# Altium footprint library ParsaLibrary.PcbLib: 526 footprints (part 13 of 33)
Each footprint in its own frame and in the unit in brackets; x right, y up, seen from the top. Pads: shape width x height; smd on the part's side, far side on the other; paste and mask are expansions set on the pad; w line width, h text height; cw(c..) or ccw(c..) is an arc to the next point about the centre after c.
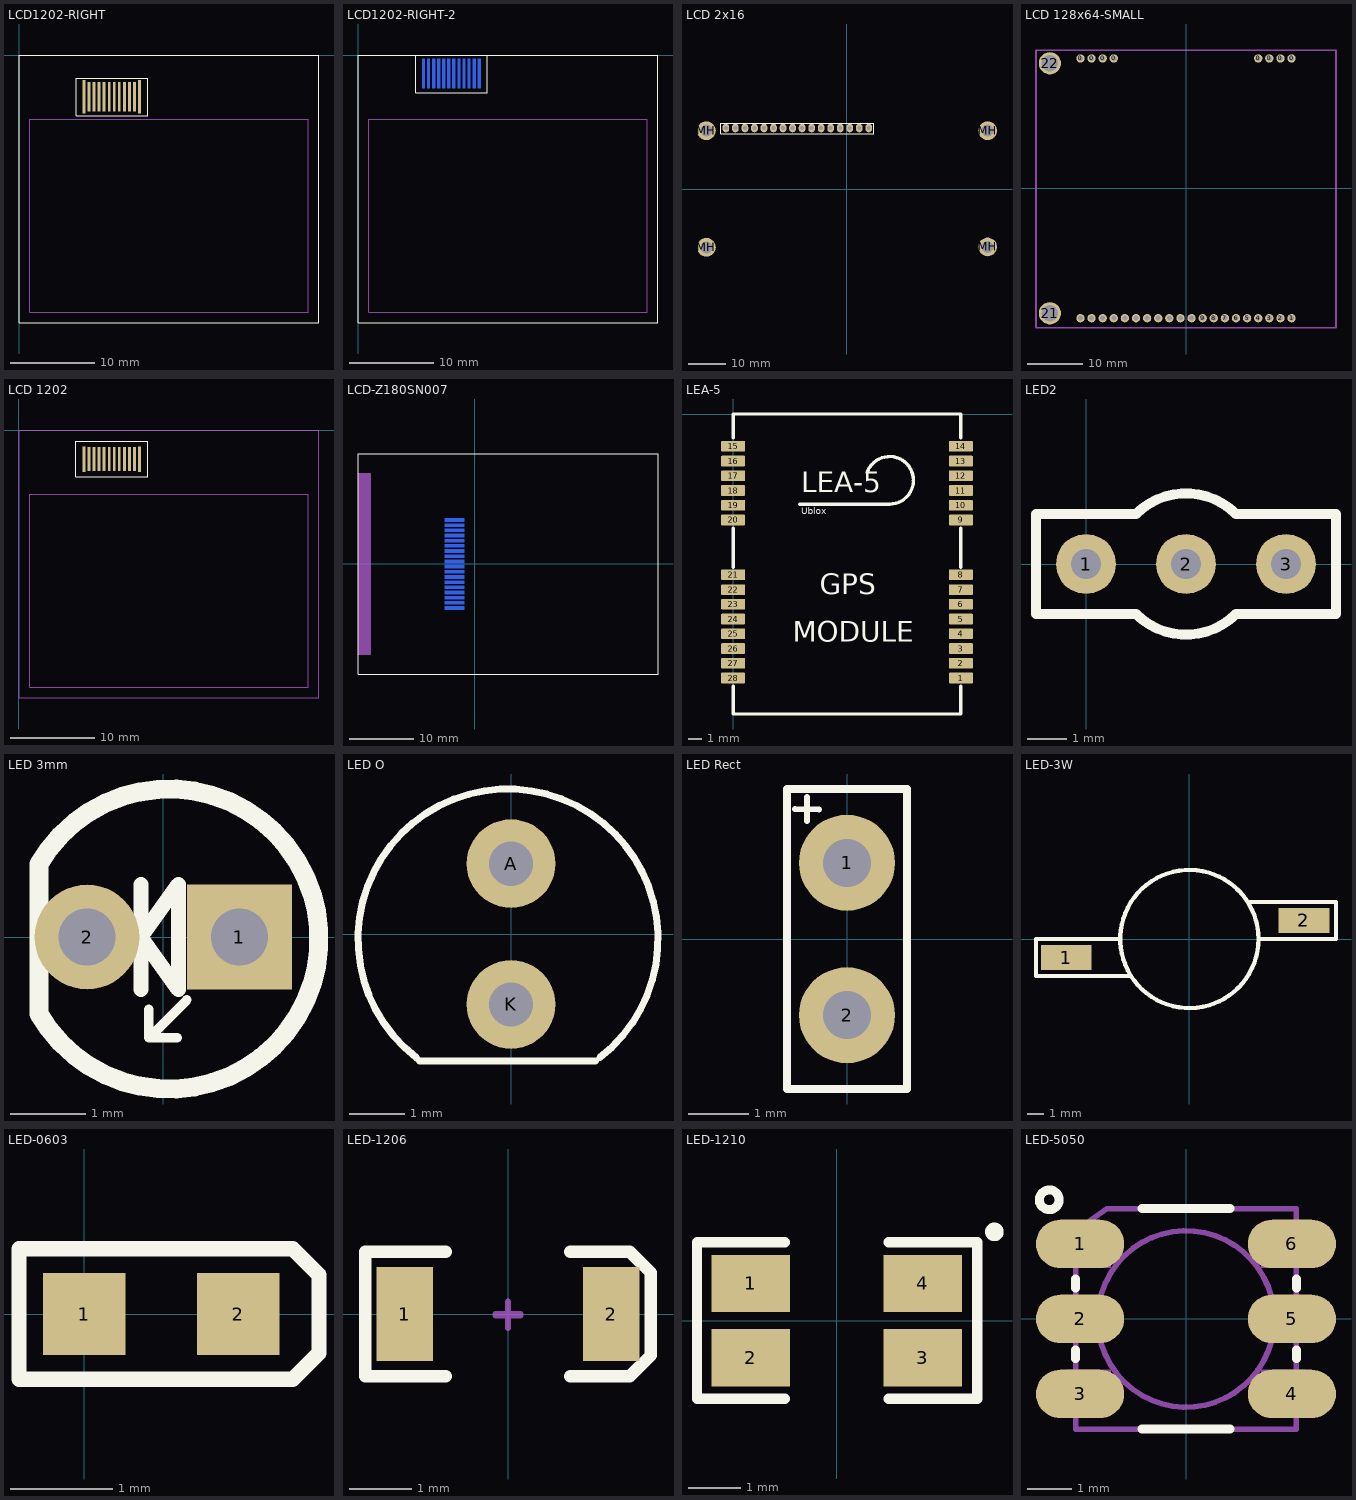
[diagram p12: the footprints below, top view; thin cyan lines are the x and y axes]

## LCD1202-RIGHT [mm]
pads (12):
  rect 0.33x4 smd: 0(7.69,-4.928) 11(14.29,-4.928)
  rect 0.33x3.5 smd: 1(8.29,-4.928) 2(8.89,-4.928) 3(9.49,-4.928) 4(10.09,-4.928) 5(10.69,-4.928) 6(11.29,-4.928) 7(11.89,-4.928) 8(12.49,-4.928) 9(13.09,-4.928) 10(13.69,-4.928)
Top Overlay:
  lines w0.127: 0,-31.75 35.56,-31.75 35.56,0 0,0 0,-31.75 ; 6.782,-7.188 15.272,-7.188 15.272,-2.718 6.782,-2.718 6.782,-7.188
Mechanical 16:
  lines w0.127: 1.27,-30.48 34.29,-30.48 34.29,-7.62 1.27,-7.62 1.27,-30.48

## LCD1202-RIGHT-2 [mm]
pads (12):
  rect 0.33x3.5 smd far side: 0(7.766,-2.21) 1(8.366,-2.21) 2(8.966,-2.21) 3(9.566,-2.21) 4(10.166,-2.21) 5(10.766,-2.21) 6(11.366,-2.21) 7(11.966,-2.21) 8(12.566,-2.21) 9(13.166,-2.21) 10(13.766,-2.21) 11(14.366,-2.21)
Top Overlay:
  lines w0.127: 6.858,0 6.858,-4.47 15.348,-4.47 15.348,0 ; 0,-31.75 35.56,-31.75 35.56,0 0,0 0,-31.75
Mechanical 16:
  lines w0.127: 1.27,-30.48 34.29,-30.48 34.29,-7.62 1.27,-7.62 1.27,-30.48
3D body: height 1.5, standoff 0, extent 0,-31.75 35.56,0
3D body: height 2, standoff 0, extent 1.27,-30.48 34.29,-7.62
3D body: height 1.6, standoff 0, extent 0.635,-6.985 34.925,-0.635

## LCD 2x16 [mm] "Character LCD, 2 Row, 16 Colunm"
height 1
pads (20):
  oval 1.778x2.286 hole 1.016: 1(-32.3,16.25) 2(-29.76,16.25) 3(-27.22,16.25) 4(-24.68,16.25) 5(-22.14,16.25) 6(-19.6,16.25) 7(-17.06,16.25) 8(-14.52,16.25) 9(-11.98,16.25) 10(-9.44,16.25) 11(-6.9,16.25) 12(-4.36,16.25) 13(-1.82,16.25) 14(0.72,16.25) 15(3.26,16.25) 16(5.8,16.25)
  round 5 hole 3.2: MH(-37.5,-15.55) MH(-37.5,15.55) MH(37.5,-15.45) MH(37.5,15.55)
Top Overlay:
  lines w0.254: -33.6,14.8 7.1,14.8 7.1,17.6 -33.6,17.6 -33.6,14.8
3D body "My LCD.STEP": height 21.52, standoff 8.31, extent -40.234,-18.39 40.266,18.11
3D body "header16-15mm.STEP": height 18.03, standoff -2.54, extent -33.57,14.98 7.07,17.52

## LCD 128x64-SMALL [mm]
pads (30):
  round 1.5 hole 0.9: 0(-19,23.375) 0(-17,23.375) 0(-15,23.375) 0(-13,23.375) 0(13,23.375) 0(15,23.375) 0(17,23.375) 0(19,23.375) 1(19,-23.375) 2(17,-23.375) 3(15,-23.375) 4(13,-23.375) 5(11,-23.375) 6(9,-23.375) 7(7,-23.375) 8(5,-23.375) 9(3,-23.375) 10(1,-23.375) 11(-1,-23.375) 12(-3,-23.375) 13(-5,-23.375) 14(-7,-23.375) 15(-9,-23.375) 16(-11,-23.375) 17(-13,-23.375) 18(-15,-23.375) 19(-17,-23.375) 20(-19,-23.375)
  round 4 hole 3: 21(-24.5,-22.5) 22(-24.5,22.5)
Mechanical 13:
  lines w0.3: -27,-25.125 -27,24.875 27,24.875 27,-25.125 -27,-25.125
3D body "User Library-User Library-WG12864e.step": height 13.2, standoff -4.8, extent -28,-25 27,25

## LCD 1202 [mil] "NOKIA 1202 LCD"
pads (12):
  rect 13x119 smd: 0(303.76,-134) 11(563.6,-134)
  rect 13x111 smd: 1(327.38,-134) 2(351,-134) 3(374.62,-134) 4(398.24,-134) 5(421.87,-134) 6(445.49,-134) 7(469.11,-134) 8(492.73,-134) 9(516.35,-134) 10(539.98,-134)
Top Overlay:
  lines w5: 266.75,-216 266.75,-51 601,-51 601,-216 266.75,-216
Mechanical 1:
  lines w5: 1,-1249 1,1 1401,1 1401,-1249 1,-1249 ; 51,-1199 51,-299 1351,-299 1351,-1199 51,-1199
3D body: height 78.74, standoff 0, extent 1,-1249 1401,1
3D body: height 94.49, standoff 0, extent 50,-1200 1350,-300

## LCD-Z180SN007 [mm]
pads (18):
  rect 3x0.5 smd far side: 1(-3.1,6.8) 2(-3.1,6) 3(-3.1,5.2) 4(-3.1,4.4) 5(-3.1,3.6) 6(-3.1,2.8) 7(-3.1,2) 8(-3.1,1.2) 9(-3.1,0.4) 10(-3.1,-0.4) 11(-3.1,-1.2) 12(-3.1,-2) 13(-3.1,-2.8) 14(-3.1,-3.6) 15(-3.1,-4.4) 16(-3.1,-5.2) 17(-3.1,-6) 18(-3.1,-6.8)
Top Overlay:
  lines w0.127: -18,-17 28.3,-17 28.3,17 -18,17 -18,-17
Mechanical 15:
  pour cut-out: -16,14 -18,14 -18,-14 -16,-14
3D body "User Library-JD-T18003.step": height 2.6, standoff -0.1, extent -18.027,-17 28.2,17

## LEA-5 [mm] "GPS MODULE"
pads (28):
  rrect20% 1.8x0.8 smd: 1(17,-19.713) 2(17,-18.613) 3(17,-17.513) 4(17,-16.413) 5(17,-15.313) 6(17,-14.213) 7(17,-13.113) 8(17,-12.013) 9(17,-7.913) 10(17,-6.813) 11(17,-5.713) 12(17,-4.613) 13(17,-3.513) 14(17,-2.413) 15(0,-2.413) 16(0,-3.513) 17(0,-4.613) 18(0,-5.713) 19(0,-6.813) 20(0,-7.913) 21(0,-12.013) 22(0,-13.113) 23(0,-14.213) 24(0,-15.313) 25(0,-16.413) 26(0,-17.513) 27(0,-18.613) 28(0,-19.713)
Top Overlay:
  lines w0.254: 0,-20.32 0,-22.4 17,-22.4 17,-20.32 ; 0,-11.43 0,-8.509 ; 0,-1.778 0,0 17,0 17,-1.778 ; 4.953,-6.731 11.684,-6.731 ccw(c11.684,-4.953) 9.997,-4.391 ; 17,-11.43 17,-8.509
  text "LEA-5" at 5.08,-5.842 h1.52
  text "GPS" at 6.477,-13.462 h1.52
  text "MODULE" at 4.445,-17.018 h1.52
  text "Ublox" at 5.08,-7.493 h0.5

## LED2 [mil] "LED 3 LEAD"
height 196.85
pads (3):
  round 60 hole 30: 1(0,0) 2(100,0) 3(200,0)
Top Overlay:
  lines w10: -50,-50 50,-50 ccw(c100,0) 150,-50 250,-50 250,50 150,50 ccw(c100,0) 50,50 -50,50 -50,-50
3D body "User Library-3mmBiColorLED.step": height 362.48, standoff -32.52, extent -10,-79.69 210,79.71

## LED 3mm [mil]
pads (2):
  rect 55x55 hole 30: 1(40,0)
  round 55 hole 30: 2(-40,0)
Top Overlay:
  lines w5: -7.6,-37.95 -7.6,-52.95 ; 7.4,-52.95 -7.6,-52.95 ; 12.4,-32.95 -7.6,-52.95
  lines w7.87: -11.81,-27.56 -11.81,27.56 ; -11.81,0 7.87,-27.56 7.87,27.56 -11.81,0
  lines w10: -65.19,-40.37 ccw(c3,-1) -65.19,38.37 -65.19,-40.37
3D body "LED.STEP": height 153.55, standoff -59.05, extent -68.9,-68.8 68.9,69

## LED O [mm]
pads (2):
  round 1.6 hole 0.8: A(0,1.27) K(0,-1.27)
Top Overlay:
  lines w0.127: -1.707,-2.232 cw(c-0.055,-0.089) 1.604,-2.226 ; -1.651,-2.286 1.524,-2.286

## LED Rect [mm]
pads (2):
  round 1.6 hole 0.8: 1(0,1.27) 2(0,-1.27)
Top Overlay:
  lines w0.1: -0.865,2.164 -0.465,2.162 ; -0.666,1.963 -0.664,2.363
  lines w0.127: -1,-2.5 1,-2.5 1,2.5 -1,2.5 -1,-2.5
3D body: height 7, standoff 0, extent -1,-2.5 1,2.5

## LED-3W [mm]
pads (2):
  rect 3x1.5 smd: 1(-7.3,-1.1) 2(6.8,1.1)
Top Overlay:
  circle w0.254: c0,0 r4.1
  lines w0.254: -4.2,0 -9.1,0 -9.1,-2.2 -3.5,-2.2 ; 3.5,2.2 8.7,2.2 8.7,0 4.1,0
Top Solder:
  circle w3: c0,0 r1.5
3D body "User Library-3W-Led-1 (1).step": height 5.9, standoff -0.05, extent -7.586,-4 7.086,4

## LED-0603 [mm]
pads (2):
  rect 0.8x0.8 smd: 1(0,0) 2(1.5,0)
Top Overlay:
  lines w0.15: -0.635,-0.635 2.032,-0.635 2.286,-0.381 2.286,0.381 2.032,0.635 -0.635,0.635 -0.635,-0.635
3D body "LED 0603 single color.stp": height 0.7, standoff -0.01, extent -0.038,-0.406 1.562,0.381

## LED-1206 [mm]
pads (2):
  rect 0.9x1.5 smd: 1(-1.651,0) 2(1.651,0)
Top Overlay:
  lines w0.2: -1,-1 -2.286,-1 -2.286,1 -1,1 ; 1,-1 1.946,-1 2.286,-0.66 2.286,0.66 1.956,0.991 ; 1,1 1.949,1
Mechanical 1:
  lines w0.1: -0.2,-0.025 0.2,-0.025 ; -0.2,0 0.2,0 ; 0,-0.225 0,0.175 ; 0,-0.2 0,0.2
3D body "SW3dPS-LED_SMD_SML010L_Red.STEP": height 1.36, standoff 0.01, extent -1.65,-0.762 1.65,0.688

## LED-1210 [mm]
pads (4):
  rect 1.5x1.1 smd: 1(-1.651,0.713) 2(-1.651,-0.713) 3(1.651,-0.713) 4(1.651,0.713)
Top Overlay:
  circle w0.254: c3.023,1.702 r0.051
  lines w0.2: -1,-1.5 -2.681,-1.5 -2.681,1.5 -1,1.5 ; 1,-1.5 2.696,-1.5 2.696,1.5 1,1.5
3D body "User Library-led_1210.step": height 1.1, standoff -0.05, extent -1.62,-1.363 1.62,1.337

## LED-5050 [mm]
pads (6):
  rrect100% 2x1.1 smd: 1(-2.4,1.7) 2(-2.4,0) 3(-2.4,-1.7) 4(2.4,-1.7) 5(2.4,0) 6(2.4,1.7)
Top Overlay:
  circle w0.203: c-3.1,2.7 r0.224
  lines w0.203: -2.5,-0.9 -2.5,-0.7 ; -2.5,0.7 -2.5,0.9 ; -1,-2.5 1,-2.5 ; -1,2.5 1,2.5 ; 2.5,-0.9 2.5,-0.7 ; 2.5,0.7 2.5,0.9
Mechanical 16:
  circle w0.127: c0,0 r2
  rectangle: 1.7,-0.45 2.7,0.45
  rectangle: 1.7,1.15 2.7,2.05
  rectangle: 1.7,-2.05 2.7,-1.15
  region: -1.7,2.05 -2.7,2.05 -2.7,1.15 -1.7,1.15
  region: -1.7,0.45 -2.7,0.45 -2.7,-0.45 -1.7,-0.45
  region: -1.7,-1.15 -2.7,-1.15 -2.7,-2.05 -1.7,-2.05
  lines w0.127: -2.5,-2.5 -2.5,2 -1.8,2.5 2.5,2.5 2.5,-2.5 -2.5,-2.5
3D body "User Library-APA102C.step": height 1.4, standoff -0.15, extent -2.75,-2.5 2.75,2.5